# Altium footprint library PCBLIB.PcbLib: 775 footprints (part 31 of 49)
Each footprint in its own frame and in the unit in brackets; x right, y up, seen from the top. Pads: shape width x height; smd on the part's side, far side on the other; paste and mask are expansions set on the pad; w line width, h text height; cw(c..) or ccw(c..) is an arc to the next point about the centre after c.
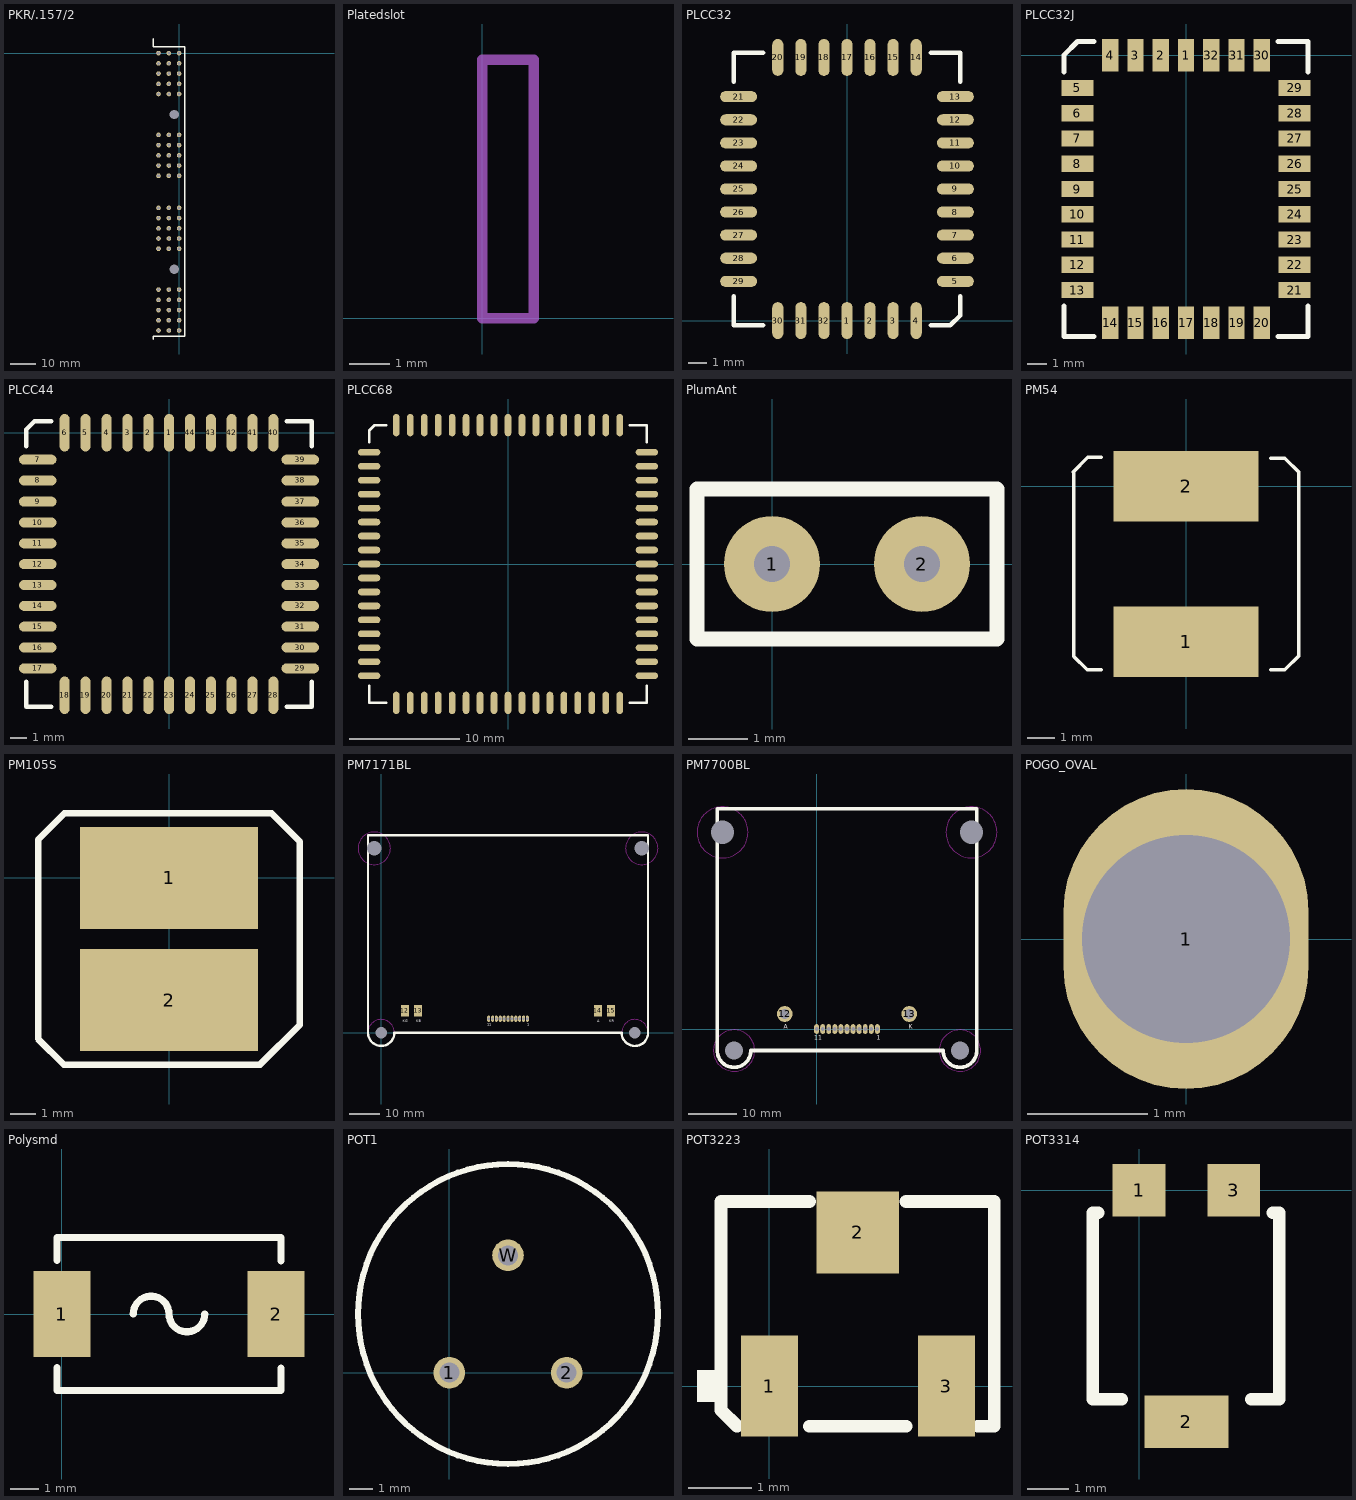
[diagram p30: the footprints below, top view; thin cyan lines are the x and y axes]

## PKR/.157/2 [mil]
pads (62):
  round 70 hole 140: 61(-74,-3298) 63(-74,-936)
  round 70 hole 45: A1(0,0) A2(-157,0) A3(-314,0) B1(0,-156) B2(-157,-156) B3(-314,-156) C1(0,-312) C2(-157,-312) C3(-314,-312) D1(0,-468) D2(-157,-468) D3(-314,-468) E1(0,-624) E2(-157,-624) E3(-314,-624) F1(0,-1248) F2(-157,-1248) F3(-314,-1248) G1(0,-1404) G2(-157,-1404) G3(-314,-1404) H1(0,-1560) H2(-157,-1560) H3(-314,-1560) J1(0,-1716) J2(-157,-1716) J3(-314,-1716) K1(0,-1872) K2(-157,-1872) K3(-314,-1872) L1(0,-2362) L2(-157,-2362) L3(-314,-2362) M1(0,-2518) M2(-157,-2518) M3(-314,-2518) N1(0,-2674) N2(-157,-2674) N3(-314,-2674) P1(0,-2830) P2(-157,-2830) P3(-314,-2830) R1(0,-2986) R2(-157,-2986) R3(-314,-2986) S1(0,-3610) S2(-157,-3610) S3(-314,-3610) T1(0,-3766) T2(-157,-3766) T3(-314,-3766) W1(0,-3922) W2(-157,-3922) W3(-314,-3922) X1(0,-4078) X2(-157,-4078) X3(-314,-4078) Y1(0,-4234) Y2(-157,-4234) Y3(-314,-4234)
TopOverlay:
  lines w24: -394,-4364 -394,-4324 86,-4324 86,96 -394,96 -394,216

## Platedslot [mil]
TopPaste:
  rectangle: -20,-20 70,0
  rectangle: 50,0 70,270
  rectangle: -20,250 50,270
  rectangle: -20,0 0,250
TopSolder:
  rectangle: -20,-20 70,0
  rectangle: -20,250 50,270
  rectangle: -20,0 0,250
  rectangle: 50,0 70,270
Mechanical1:
  lines w10: 0,0 0,250 50,250 50,0 0,0
Mechanical4:
  text "0" at 0,0 h1
MultiLayer:
  rectangle: -20,-20 70,0
  rectangle: -20,250 50,270
  rectangle: -20,0 0,250
  rectangle: 50,0 70,270

## PLCC32 [mil]
pads (32):
  oval 24x80 smd: 1(0,0) 2(50,0) 3(100,0) 4(150,0) 14(150,570) 15(100,570) 16(50,570) 17(0,570) 18(-50,570) 19(-100,570) 20(-150,570) 30(-150,0) 31(-100,0) 32(-50,0)
  oval 80x24 smd: 5(235,85) 6(235,135) 7(235,185) 8(235,235) 9(235,285) 10(235,335) 11(235,385) 12(235,435) 13(235,485) 21(-235,485) 22(-235,435) 23(-235,385) 24(-235,335) 25(-235,285) 26(-235,235) 27(-235,185) 28(-235,135) 29(-235,85)
TopOverlay:
  lines w10: -245,53 -245,-10 -182,-10 ; -245,517 -245,580 -182,580 ; 182,-10 224,-10 245,11 245,53 ; 182,580 245,580 245,517
  text "." at 5,-70 h60
Mechanical4:
  text ".1" at 0,10 h1

## PLCC32J [mil]
pads (32):
  rect 32x64 smd: 1(0,0) 2(-50,0) 3(-100,0) 4(-150,0) 14(-150,-530) 15(-100,-530) 16(-50,-530) 17(0,-530) 18(50,-530) 19(100,-530) 20(150,-530) 30(150,0) 31(100,0) 32(50,0)
  rect 64x32 smd: 5(-215,-65) 6(-215,-115) 7(-215,-165) 8(-215,-215) 9(-215,-265) 10(-215,-315) 11(-215,-365) 12(-215,-415) 13(-215,-465) 21(215,-465) 22(215,-415) 23(215,-365) 24(215,-315) 25(215,-265) 26(215,-215) 27(215,-165) 28(215,-115) 29(215,-65)
TopOverlay:
  lines w10: -242,-497 -242,-557 -182,-557 ; -242,-33 -242,0 -215,27 -182,27 ; 182,-557 242,-557 242,-497 ; 182,27 242,27 242,-33
  text "." at -5,55 h60

## PLCC44 [mil]
pads (44):
  oval 24x90 smd: 1(0,0) 2(-50,0) 3(-100,0) 4(-150,0) 5(-201,0) 6(-251,0) 18(-251,-630) 19(-201,-630) 20(-150,-630) 21(-100,-630) 22(-50,-630) 23(0,-630) 24(50,-630) 25(100,-630) 26(150,-630) 27(200,-630) 28(250,-630) 40(250,0) 41(200,0) 42(150,0) 43(100,0) 44(50,0)
  oval 90x24 smd: 7(-315.5,-64.5) 8(-315.5,-114.5) 9(-315.5,-165.5) 10(-315.5,-215.5) 11(-315.5,-265.5) 12(-315.5,-315.5) 13(-315.5,-365.5) 14(-315.5,-415.5) 15(-315.5,-465.5) 16(-315.5,-515.5) 17(-315.5,-565.5) 29(314.5,-565.5) 30(314.5,-515.5) 31(314.5,-465.5) 32(314.5,-415.5) 33(314.5,-365.5) 34(314.5,-315.5) 35(314.5,-265.5) 36(314.5,-215.5) 37(314.5,-165.5) 38(314.5,-114.5) 39(314.5,-64.5)
TopOverlay:
  lines w10: -343,-597.5 -343,-657.5 -283,-657.5 ; -343,-32.5 -343,7.5 -323,27.5 -283,27.5 ; 282,-657.5 342,-657.5 342,-597.5 ; 282,27.5 342,27.5 342,-32.5
  text "." at -8,67.5 h80
Mechanical4:
  text ".080" at 0,7.5 h1

## PLCC68 [mil]
pads (68):
  oval 24x80 smd: 1(0,497) 2(-50,497) 3(-100,497) 4(-150,497) 5(-200,497) 6(-250,497) 7(-300,497) 8(-350,497) 9(-400,497) 27(-400,-497) 28(-350,-497) 29(-300,-497) 30(-250,-497) 31(-200,-497) 32(-150,-497) 33(-100,-497) 34(-50,-497) 35(0,-497) 36(50,-497) 37(100,-497) 38(150,-497) 39(200,-497) 40(250,-497) 41(300,-497) 42(350,-497) 43(400,-497) 61(400,497) 62(350,497) 63(300,497) 64(250,497) 65(200,497) 66(150,497) 67(100,497) 68(50,497)
  oval 80x24 smd: 10(-497,400) 11(-497,350) 12(-497,300) 13(-497,250) 14(-497,200) 15(-497,150) 16(-497,100) 17(-497,50) 18(-497,0) 19(-497,-50) 20(-497,-100) 21(-497,-150) 22(-497,-200) 23(-497,-250) 24(-497,-300) 25(-497,-350) 26(-497,-400) 44(497,-400) 45(497,-350) 46(497,-300) 47(497,-250) 48(497,-200) 49(497,-150) 50(497,-100) 51(497,-50) 52(497,0) 53(497,50) 54(497,100) 55(497,150) 56(497,200) 57(497,250) 58(497,300) 59(497,350) 60(497,400)
TopOverlay:
  lines w10: -497,-437 -497,-497 -437,-497 ; -497,437 -497,477 -477,497 -437,497 ; 437,-497 497,-497 497,-437 ; 437,497 497,497 497,437
  text "." at -6,572 h80
Mechanical4:
  text ".080" at 1197,494 h1

## PlumAnt [mil]
pads (2):
  round 64 hole 24: 1(0,0) 2(100,0)
TopOverlay:
  lines w10: -50,-50 -50,50 150,50 150,-50 -50,-50

## PM54 [mil]
pads (2):
  rect 205x100 smd: 1(0,-220) 2(0,0)
TopOverlay:
  lines w5: -160,20 -139,41 -120,41 ; -159,19 -159,-241 -140,-260 -120,-260 ; 120,-260 140,-260 160,-240 160,20 140,40 120,40
Mechanical4:
  text ".190" at 0,0 h1

## PM105S [mm]
pads (2):
  rect 7x4 smd: 1(0,0) 2(0,-4.8)
TopOverlay:
  lines w0.254: -5.15,-6.331 -4.141,-7.34 -1.702,-7.34 1.956,-7.34 3.582,-7.34 5.15,-5.772 5.15,-4.877 5.15,0.787 5.15,1.429 4.039,2.54 2.388,2.54 -2.032,2.54 -4.115,2.54 -5.15,1.505 -5.15,0.635 -5.15,-5.334 -5.15,-6.331

## PM7171BL [mil]
pads (19):
  oval 40x80 hole 30: 1(1888,180) 2(1838,180) 3(1788,180) 4(1738,180) 5(1688,180) 6(1638,180) 7(1588,180) 8(1538,180) 9(1488,180) 10(1438,180) 11(1388,180)
  rect 100x150 smd: 12(307,283) 13(476,283) 14(2799,283) 15(2968,283)
  round 0 hole 190 unplated: MH(-89,2380) MH(3364,2380)
  round 0 hole 150 unplated: MH(0,0) MH(3276,0)
TopOverlay:
  lines w30: 3104.37,-1.26 ccw(c3276,0) 3277.26,-171.63 ccw(c3275.82,-1.45) 3446,0 3446,2182.18 3446,2549 -170.37,2549 -170.37,2184.64 -170.37,-0.19 ccw(c1.6,1.18) 2.97,-170.79 ccw(c1.09,-1.88) 170,0 3104.9,0
  text "11" at 1369.77,91.56 h35
  text "1" at 1883.75,89.87 h35
  text "KG" at 280,134 h35
  text "KB" at 450,134 h35
  text "A" at 2786.69,134 h35
  text "KR" at 2942.54,134 h35
MultiLayer keep-out:
  circle w10: c3364,2380 r210
  circle w10: c-89,2380 r210
  circle w10: c3276,0 r170
  circle w10: c0,0 r170

## PM7700BL [mil]
pads (17):
  oval 40x80 hole 30: 1(500,0) 2(450,0) 3(400,0) 4(350,0) 5(300,0) 6(250,0) 7(200,0) 8(150,0) 9(100,0) 10(50,0) 11(0,0)
  round 130 hole 80: 12(-261.81,124.02) 13(761.81,124.02)
  round 0 hole 190 unplated: MH(-773.62,1618) MH(1273.62,1618)
  round 0 hole 150 unplated: MH(-679.13,-177.16) MH(1179.13,-177.16)
TopOverlay:
  lines w30: -816.93,-178.26 -816.93,98.43 -816.93,1811.02 1316.93,1811.02 1316.93,-180 ; -816.92,-178.26 ccw(c-679.13,-177.17) -678.03,-314.96 ; -677.52,-314.95 ccw(c-679.06,-177.17) -541.26,-177.17 ; -541.34,-177.17 1041.34,-177.17 ; 1041.34,-178.18 ccw(c1179.13,-177.17) 1180.15,-314.96 ; 1180.31,-314.96 ccw(c1179.13,-177.17) 1316.92,-175.99
  text "1" at 495.75,-90.13 h35
  text "11" at -18.23,-88.44 h35
  text "A" at -270.89,1.35 h35
  text "K" at 756.59,1.35 h35
MultiLayer keep-out:
  circle w10: c-679.13,-177.16 r170
  circle w10: c1179.13,-177.16 r170
  circle w10: c-773.62,1618 r210
  circle w10: c1273.62,1618 r210

## POGO_OVAL [mil]
pads (1):
  oval 80x98 hole 68: 1(0,0)

## Polysmd [mil]
pads (2):
  rect 80x120 smd: 1(0,0) 2(300,0)
TopOverlay:
  lines w10: -7,-75 -7,-107 307,-107 307,-76 ; -7,75 -7,107 307,107 307,74 ; 100,0 cw(c125,0) 150,0 ccw(c175,0) 200,0
Mechanical4:
  text ".125" at 0,0 h1

## POT1 [mil]
pads (3):
  round 54 hole 34: 1(0,0) 2(200,0) W(100,200)
TopOverlay:
  circle w10: c100,100 r255.91
Mechanical4:
  text "1.5" at 0,0 h1

## POT3223 [mm]
pads (3):
  rect 0.9x1.6 smd: 1(0,0) 3(2.8,0)
  rect 1.3x1.3 smd: 2(1.4,2.43)
TopOverlay:
  rectangle: -1.143,-0.254 -0.762,0.254
  lines w0.203: -0.762,0.127 -0.762,-0.381 ; -0.508,-0.635 -0.762,-0.381 ; 0.635,-0.635 2.159,-0.635 ; 0.635,2.921 -0.762,2.921 -0.762,-0.381 ; 2.159,2.921 3.556,2.921 3.556,-0.635 3.302,-0.635

## POT3314 [mil]
pads (3):
  rect 50x50 smd: 1(-0.18,0) 3(89.82,0)
  rect 80x50 smd: 2(44.82,-220)
TopOverlay:
  lines w12: -39.25,-21.43 -44.17,-21.43 -44.17,-198.59 -16.61,-198.59 ; 106.42,-198.59 132.99,-198.59 132.99,-21.43 127.09,-21.43